# Altium footprint library 二极管封装库.PcbLib: 222 footprints (part 7 of 14)
Each footprint in its own frame and in the unit in brackets; x right, y up, seen from the top. Pads: shape width x height; smd on the part's side, far side on the other; paste and mask are expansions set on the pad; w line width, h text height; cw(c..) or ccw(c..) is an arc to the next point about the centre after c.
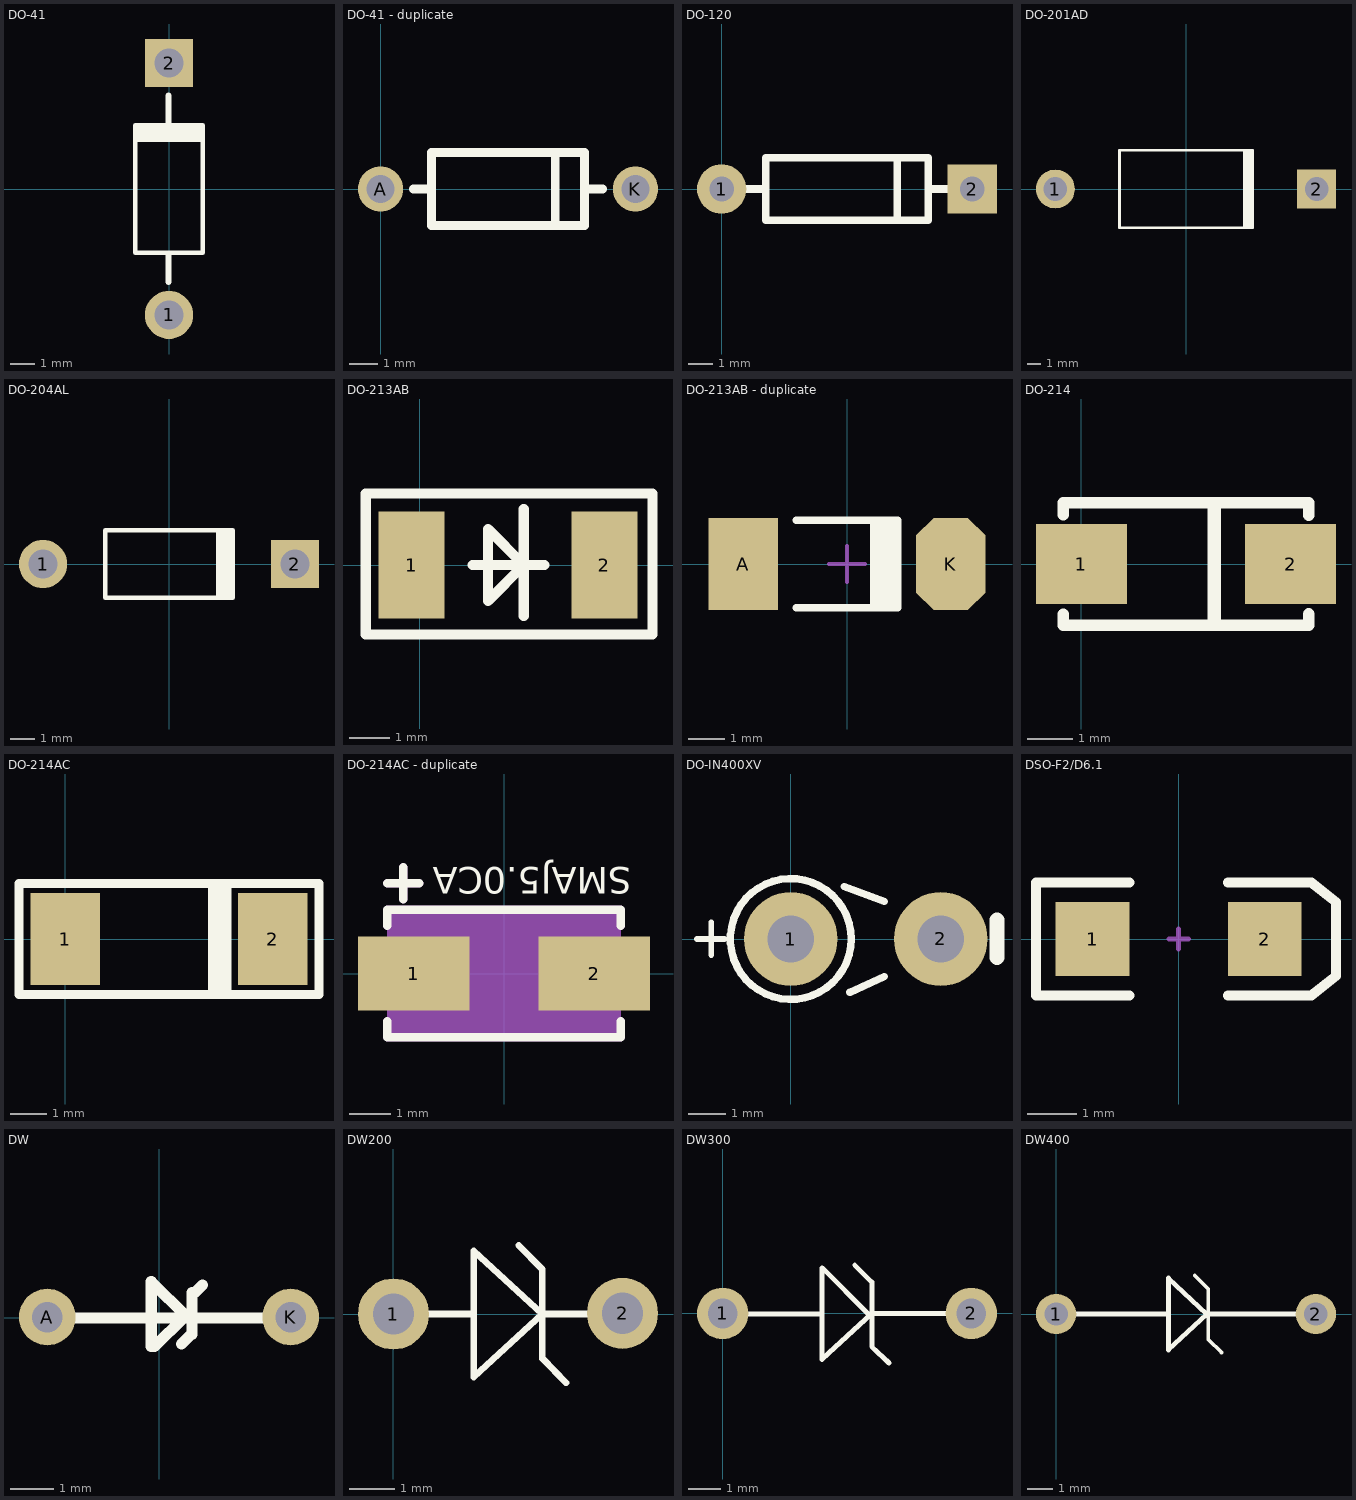
[diagram p6: the footprints below, top view; thin cyan lines are the x and y axes]

## DO-41 [mm]
pads (2):
  round 2 hole 1.2: 1(0,-5.23)
  rect 2x2 hole 1.2: 2(0,5.23)
Top Overlay:
  region: 1.4,1.95 1.4,2.75 -1.4,2.75 -1.4,1.95
  lines w0.2: -1.4,2.65 -1.4,-2.65 1.4,-2.65 1.4,2.65
  lines w0.254: -0.025,-3.858 -0.025,-2.69 ; -0.025,2.466 -0.025,3.889
3D body "DO-41.STEP": height 3.3, standoff -2, extent -1.279,-5.599 1.321,5.461

## DO-41 - duplicate [mil]
pads (2):
  round 62 hole 38: A(0,0) K(350,0)
Top Overlay:
  lines w12: 45,0 70,0 ; 240,-50 240,50 ; 280,0 305,0 ; 70,-50 280,-50 280,50 70,50 70,-50

## DO-120 [mm]
pads (2):
  round 2 hole 1: 1(0,0)
  rect 2x2 hole 1: 2(10.16,0)
Top Overlay:
  lines w0.305: 1.016,0 1.778,0 ; 7.112,-1.27 7.112,1.27 ; 8.382,0 9.144,0 ; 1.778,-1.27 8.382,-1.27 8.382,1.27 1.778,1.27 1.778,-1.27

## DO-201AD [mm] "Diode, Axial; Body 9.5 x 5.6 mm (LxDia. max), Lead Dia. 1.32 mm (max)"
height 5.6
pads (2):
  round 2.8 hole 1.7: 1(-9.42,0)
  rect 2.8x2.8 hole 1.7: 2(9.42,0)
Top Overlay:
  rectangle: 4.1,-2.8 4.9,2.8
  lines w0.2: 4.8,-2.8 -4.8,-2.8 -4.8,2.8 4.8,2.8
3D body "DO-201AD.STEP": height 4.51, standoff -1, extent -9.754,-2.505 9.746,2.515

## DO-204AL [mm] "Diode, Axial; Body 5.2 x 2.7 mm (LxDia. max), Lead Dia. 0.86 mm (max)"
height 2.7
pads (2):
  round 2 hole 1.2: 1(-5.23,0)
  rect 2x2 hole 1.2: 2(5.23,0)
Top Overlay:
  rectangle: 1.95,-1.4 2.75,1.4
  lines w0.2: 2.65,-1.4 -2.65,-1.4 -2.65,1.4 2.65,1.4
3D body "DO-204AL.STEP": height 3.51, standoff -1, extent -5.542,-1.521 5.588,1.499

## DO-213AB [mil] "LL4150X25MM"
pads (2):
  rect 65x105 smd: 1(-8,0) 2(181,0)
Top Overlay:
  lines w10: 52,0 122,0 ; 102,-50 102,55 ; -53,-68 -53,70 228,70 228,-68 -53,-68 ; 67,-35 67,35 102,0 67,-35
3D body "DO-213AB.step": height 52.56, standoff -52.56, extent -17.36,-52.12 187.36,53

## DO-213AB - duplicate [mm] "2.5*5.6mm(直径，脚距）"
height 2.54
pads (2):
  rect 1.9x2.54 smd: A(-2.85,0)
  oct 1.9x2.54 smd: K(2.85,0)
Top Overlay:
  rectangle: 0.85,-1.2 1.4,1.2
  rectangle: 0.635,-1.2 0.85,1.2
  lines w0.2: -1.4,-1.2 1.4,-1.2 1.4,1.2 -1.4,1.2
Mechanical 15:
  lines w0.1: -0.5,0 0.5,0 ; 0,-0.5 0,0.5
3D body "DO-213AB.STEP": height 2.55, standoff 0.05, extent -2.53,-1.251 2.53,1.251

## DO-214 [mm]
height 2.7
pads (2):
  rect 2x1.75 smd: 1(0,0) 2(4.6,0)
Top Overlay:
  lines w0.254: -0.4,-1.105 -0.4,-1.35 5,-1.35 5,-1.1 ; -0.4,1.08 -0.4,1.35 4.995,1.35 ; 5,1.075 5,1.35
  lines w0.3: 2.92,-1.3 2.92,1.3
3D body "User Library-S1G.STEP": height 2.12, standoff -0.02, extent -0.198,-1.342 4.908,1.325

## DO-214AC [mil]
pads (2):
  rect 75x100 smd: 1(0,0) 2(225,0)
Top Overlay:
  rectangle: 155,-60 180,60
  lines w10: -50,-60 -50,60 275,60 275,-60 -50,-60

## DO-214AC - duplicate [mil] "DO-214AC"
pads (2):
  rect 105x70 smd: 1(-85,0) 2(85,0)
Top Overlay:
  lines w8: -110,-45 -110,-60 110,-60 110,-45 ; -110,45 -110,60 110,60 110,45 ; -110,85 -80,85 ; -95,70 -95,100
  text "SMAJ5.0CA" at 120,100 h25
Mechanical 6:
  text "1" at -135,20 h25
  text "2" at 35,20 h25
Mechanical 7:
  lines w8: -110,-45 -110,-60 110,-60 110,-45 ; -110,45 -110,60 110,60 110,45 ; -110,85 -80,85 ; -95,70 -95,100
Mechanical 8:
  region: -110,60 110,60 110,-60 -110,-60

## DO-IN400XV [mil]
pads (2):
  round 100 hole 50: 1(0,0) 2(159.98,0.03)
Top Overlay:
  circle w8: c0,0 r64.44
  lines w6: -100,0 -71,0 ; -85,-17 -85,18
  lines w7.87: 56.98,56.03 99.98,40.03 ; 62.98,-56.97 99.98,-39.97
  lines w16: 219.98,-19.97 219.98,20.03

## DSO-F2/D6.1 [mm] "SMT LED; 2 Flat Leads"
pads (2):
  rect 1.5x1.5 smd: 1(-1.75,0) 2(1.75,0)
Top Overlay:
  lines w0.2: -1,-1.15 -2.9,-1.15 -2.9,1.15 -1,1.15 ; 1,-1.15 2.7,-1.15 3.2,-0.75 3.2,0.75 2.7,1.15 1,1.15
Mechanical 1:
  lines w0.1: -0.2,0 0.2,0 ; 0,-0.2 0,0.2

## DW [mm]
pads (2):
  round 1.3 hole 0.7: A(-2.566,0.02) K(3.022,0.02)
Top Overlay:
  lines w0.254: -2.62,0 3.06,0 ; -0.18,-0.66 -0.12,-0.6 ; -0.18,-0.64 -0.14,-0.58 ; -0.18,-0.6 -0.18,0.84 0.64,0.02 0.64,0 ; -0.1,-0.66 0.58,0.02 ; 0.52,-0.6 0.76,-0.36 ; 0.52,0.08 0.6,0.08 ; 0.76,-0.38 0.76,0.56 ; 0.76,0.58 0.82,0.58 1,0.76

## DW200 [mil]
pads (2):
  round 62 hole 36: 1(0,0) 2(200,0.63)
Top Overlay:
  lines w5.91: 0,0 70,0 ; 70,-55.12 70,0.63 ; 109.33,60 130,39 130,-39 150.67,-60 ; 200,0 130,0 ; 130,0 70,-55 70,55 130,0

## DW300 [mil]
pads (2):
  round 62 hole 36: 1(0,0) 2(300,0)
Top Overlay:
  lines w1.97: 175,0 180,0
  lines w5.91: 0,-0.63 120,-0.63 ; 120,-55.75 120,0 ; 159.33,58.42 180,37.76 180,-40 200.67,-59.69 ; 175,0 120,55 120,-55 180,0 300,0

## DW400 [mil]
pads (2):
  round 62 hole 36: 1(0,0) 2(400,0)
Top Overlay:
  lines w5.91: 213.58,59.05 234.25,38.39 234.25,-39.37 254.92,-59.05
  lines w7.87: 0,0 170.03,0 ; 231.84,0 400,0 ; 172.79,-55.12 231.84,-0.44 172.79,55.12 172.79,-55.12